# Altium footprint library 二极管封装库.PcbLib: 222 footprints (part 2 of 14)
Each footprint in its own frame and in the unit in brackets; x right, y up, seen from the top. Pads: shape width x height; smd on the part's side, far side on the other; paste and mask are expansions set on the pad; w line width, h text height; cw(c..) or ccw(c..) is an arc to the next point about the centre after c.
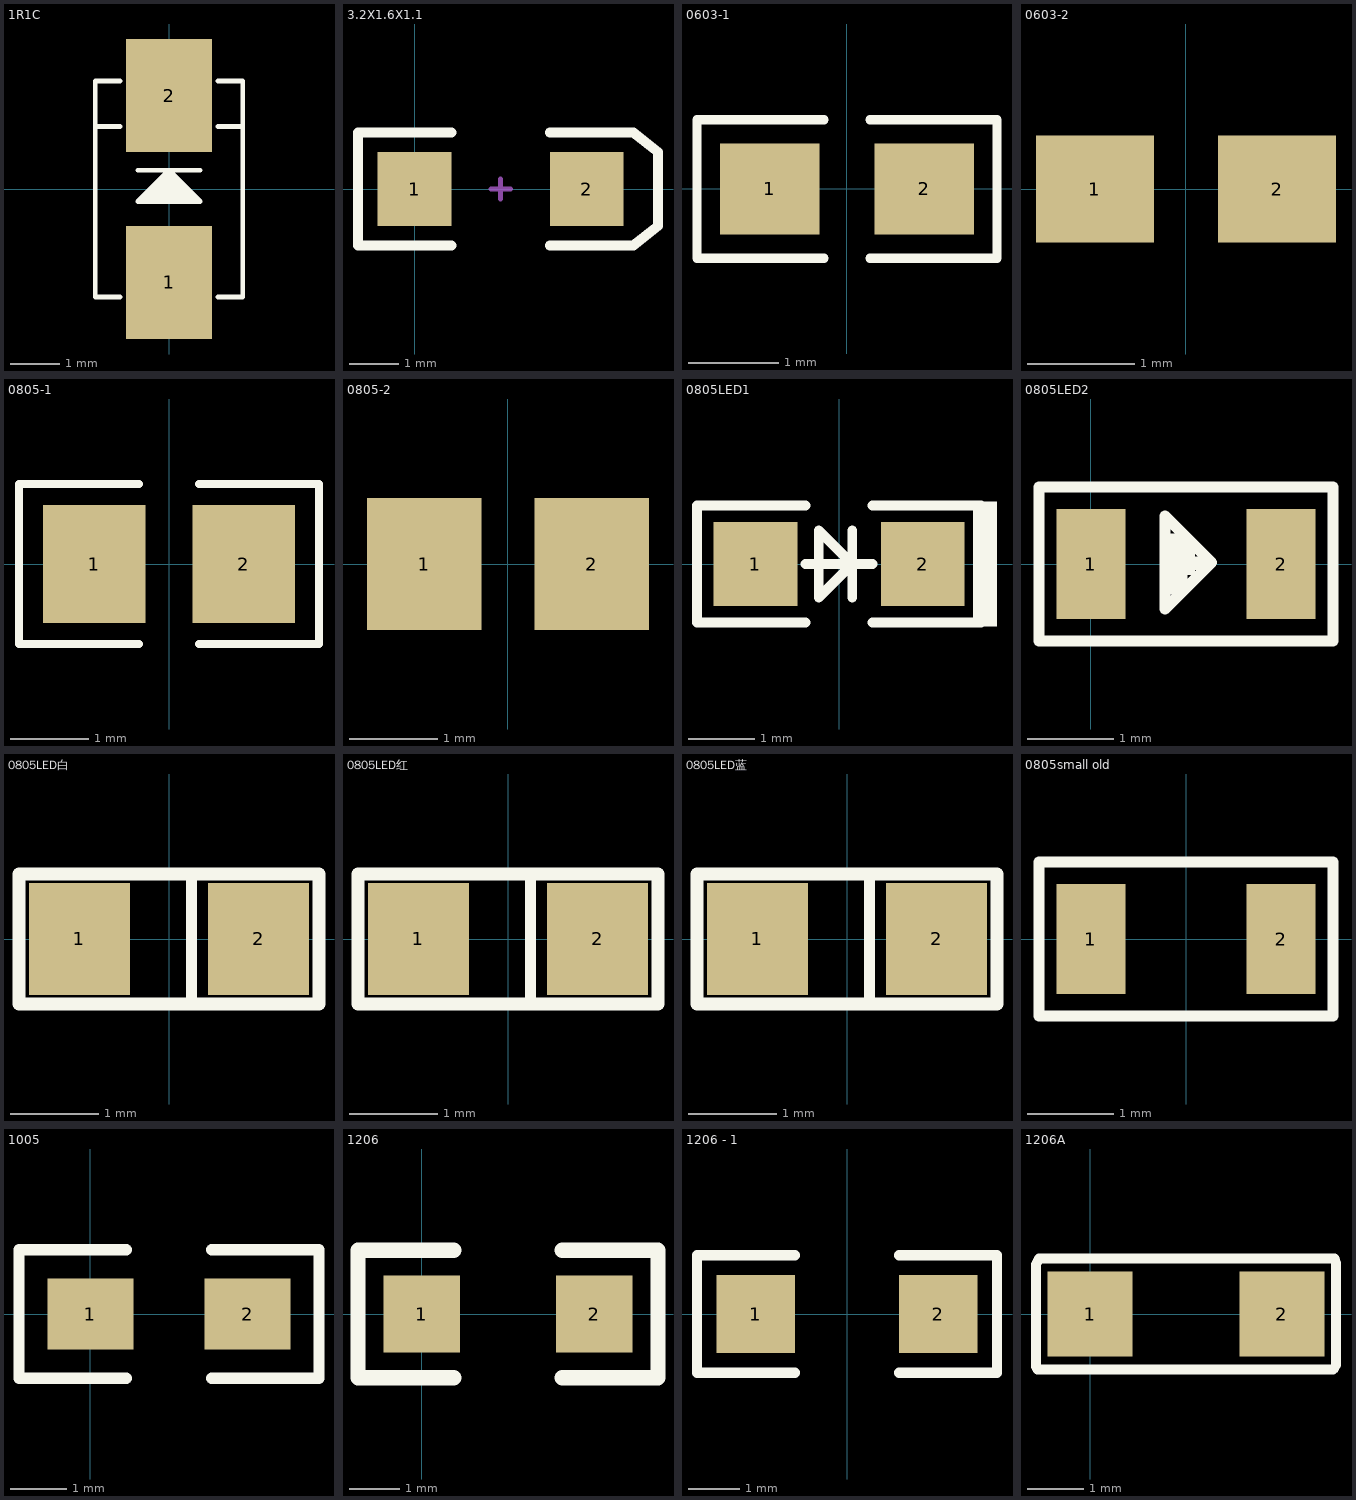
[diagram p1: the footprints below, top view; thin cyan lines are the x and y axes]

## 1R1C [mm]
pads (2):
  rect 1.75x2.3 smd: 1(0,-1.9) 2(0,1.9)
Top Overlay:
  lines w0.1: -1.5,1.27 -1,1.27 ; -1,-2.2 -1.5,-2.2 -1.5,2.2 -1,2.2 ; -0.635,0.381 0.635,0.381 ; -0.564,-0.183 0.477,-0.183 0.477,-0.096 -0.477,-0.096 ; -0.43,-0.049 0.43,-0.049 ; -0.37,0.011 0.37,0.011 ; -0.294,0.087 0.294,0.087 ; -0.213,0.168 0.213,0.168 ; -0.188,0.193 0.188,0.193 ; -0.025,0.087 -0.025,0.381 ; 0.051,-0.071 0.051,0.381 ; 1,-2.2 1.5,-2.2 1.5,2.2 1,2.2 ; 1,1.27 1.5,1.27 ; -0.635,-0.254 0.635,-0.254 0,0.381 -0.635,-0.254

## 3.2X1.6X1.1 [mm] "SMT LED; 2 Flat Leads"
pads (2):
  rect 1.5x1.5 smd: 1(0,0) 2(3.5,0)
Top Overlay:
  lines w0.2: 0.75,-1.15 -1.15,-1.15 -1.15,1.15 0.75,1.15 ; 2.75,-1.15 4.45,-1.15 4.95,-0.75 4.95,0.75 4.45,1.15 2.75,1.15
Mechanical 1:
  lines w0.1: 1.55,0 1.95,0 ; 1.75,-0.2 1.75,0.2

## 0603-1 [mm] "贴片带丝印"
height 0.6
pads (2):
  rect 1.1x1 smd: 1(-0.85,0) 2(0.85,0)
Top Overlay:
  lines w0.1: -0.254,-0.762 -1.651,-0.762 -1.651,0.762 -0.254,0.762 ; 0.254,-0.762 1.651,-0.762 1.651,0.762 0.254,0.762
3D body: height 1, standoff 0, extent -1.143,-0.381 1.143,0.381

## 0603-2 [mm] "贴片无丝印"
height 0.6
pads (2):
  rect 1.1x1 smd: 1(-0.85,0) 2(0.85,0)

## 0805-1 [mm] "贴片带丝印"
height 1.1
pads (2):
  rect 1.3x1.5 smd: 1(-0.95,0) 2(0.95,0)
Top Overlay:
  lines w0.1: -0.381,-1.016 -1.905,-1.016 -1.905,1.016 -0.381,1.016 ; 0.381,-1.016 1.905,-1.016 1.905,1.016 0.381,1.016
3D body: height 1, standoff 0, extent -1.016,-0.508 1.016,0.508
3D body: height 1, standoff 0, extent 1.016,-0.508 1.143,0.508
3D body: height 1, standoff 0, extent -1.143,-0.508 -1.016,0.508

## 0805-2 [mm] "贴片无丝印"
height 1
pads (2):
  rect 1.3x1.5 smd: 1(-0.95,0) 2(0.95,0)

## 0805LED1 [mil]
pads (2):
  rect 50x50 smd: 1(-50,0) 2(50,0)
Top Overlay:
  rectangle: 80,-37.4 94.49,37.4
  lines w5.91: -20,-35 -85,-35 -85,35 -20,35 ; -20,0 20,0 ; 7.87,-20 7.87,20 ; 20,-35 85,-35 ; 20,35 85,35 ; -12.13,-20 7.87,0 -12.13,20 -12.13,-20
3D body "User Library-led_0805.STEP": height 43.31, standoff 0, extent -36.61,-24.21 42.91,25

## 0805LED2 [mm]
pads (2):
  rect 0.8x1.27 smd: 1(0,0) 2(2.2,0)
Top Overlay:
  rectangle: 1.118,-0.068 1.396,0.018
  rectangle: 0.859,-0.351 1.061,0.156
  rectangle: 0.859,0.156 1.061,0.353
  rectangle: 0.859,-0.26 1.118,-0.068
  rectangle: 0.859,-0.129 1.205,0.267
  rectangle: 0.859,0.018 1.396,0.087
  lines w0.127: 0.859,-0.52 0.859,-0.519 ; 0.859,-0.519 1.396,0.018 0.859,0.555 0.859,-0.52 ; -0.6,-0.889 2.8,-0.889 2.8,0.889 -0.6,0.889 -0.6,-0.889
3D body "User Library-led_0805.STEP": height 1.1, standoff 0, extent 0.086,-0.615 2.106,0.635

## 0805LED白 [mil]
pads (2):
  rect 45x50 smd: 1(-40,0) 2(40,0)
Top Overlay:
  lines w5: 10,-29 10,29
  lines w5.91: -67,-29 67,-29 67,29 -67,29 -67,-29
3D body "SW3dPS-LED SMD0805.STEP": height 33.45, standoff 0.23, extent -40.6,-17 40.6,18.68

## 0805LED红 [mil]
pads (2):
  rect 45x50 smd: 1(-40,0) 2(40,0)
Top Overlay:
  lines w5: 10,-29 10,29
  lines w5.91: -67,-29 67,-29 67,29 -67,29 -67,-29
3D body "User Library-CHIPLED-0805.STEP": height 35.43, standoff -0.39, extent -41.34,-26.57 41.34,26.58

## 0805LED蓝 [mil]
pads (2):
  rect 45x50 smd: 1(-40,0) 2(40,0)
Top Overlay:
  lines w5: 10,-29 10,29
  lines w5.91: -67,-29 -67,29 67,29 67,-29 -67,-29
3D body "29532.stp": height 31.5, standoff 0, extent -39.37,-24.6 39.37,24.61

## 0805small old [mm]
pads (2):
  rect 0.8x1.27 smd: 1(-1.1,0) 2(1.1,0)
Top Overlay:
  lines w0.127: -1.7,-0.889 -1.7,0.889 1.7,0.889 1.7,-0.889 -1.7,-0.889
3D body "User Library-led_0805.STEP": height 1.1, standoff 0, extent -1.057,-0.615 0.963,0.635

## 1005 [mil]
pads (2):
  rect 60x50 smd: 1(0,0) 2(110,0)
Top Overlay:
  lines w7.87: 25,-45 -50,-45 -50,45 25,45 ; 85,-45 160,-45 160,45 85,45

## 1206 [mil]
pads (2):
  rect 60x60 smd: 1(0,0) 2(135,0)
Top Overlay:
  lines w12: 25,-50 -50,-50 -50,50 25,50 ; 110,-50 185,-50 185,50 110,50

## 1206 - 1 [mil] "贴片元件"
height 59.06
pads (2):
  rect 60x60 smd: 1(-70,0) 2(70,0)
Top Overlay:
  lines w7.87: -40,-45 -115,-45 -115,45 -40,45 ; 40,-45 115,-45 115,45 40,45
3D body: height 39.37, standoff 0, extent -75,-35 -55,35
3D body: height 39.37, standoff 0, extent 55,-35 75,35
3D body: height 39.37, standoff 0, extent -55,-35 55,35

## 1206A [mil]
pads (2):
  rect 60x60 smd: 1(0,0) 2(135,0)
Top Overlay:
  lines w7: -38,-37 -37,-39 171,-39 173,-36 173,36 172,39 -36,39 -38,35 -38,-37